# Altium footprint library IoWLabsModules.PcbLib: 54 footprints (part 3 of 4)
Each footprint in its own frame and in the unit in brackets; x right, y up, seen from the top. Pads: shape width x height; smd on the part's side, far side on the other; paste and mask are expansions set on the pad; w line width, h text height; cw(c..) or ccw(c..) is an arc to the next point about the centre after c.
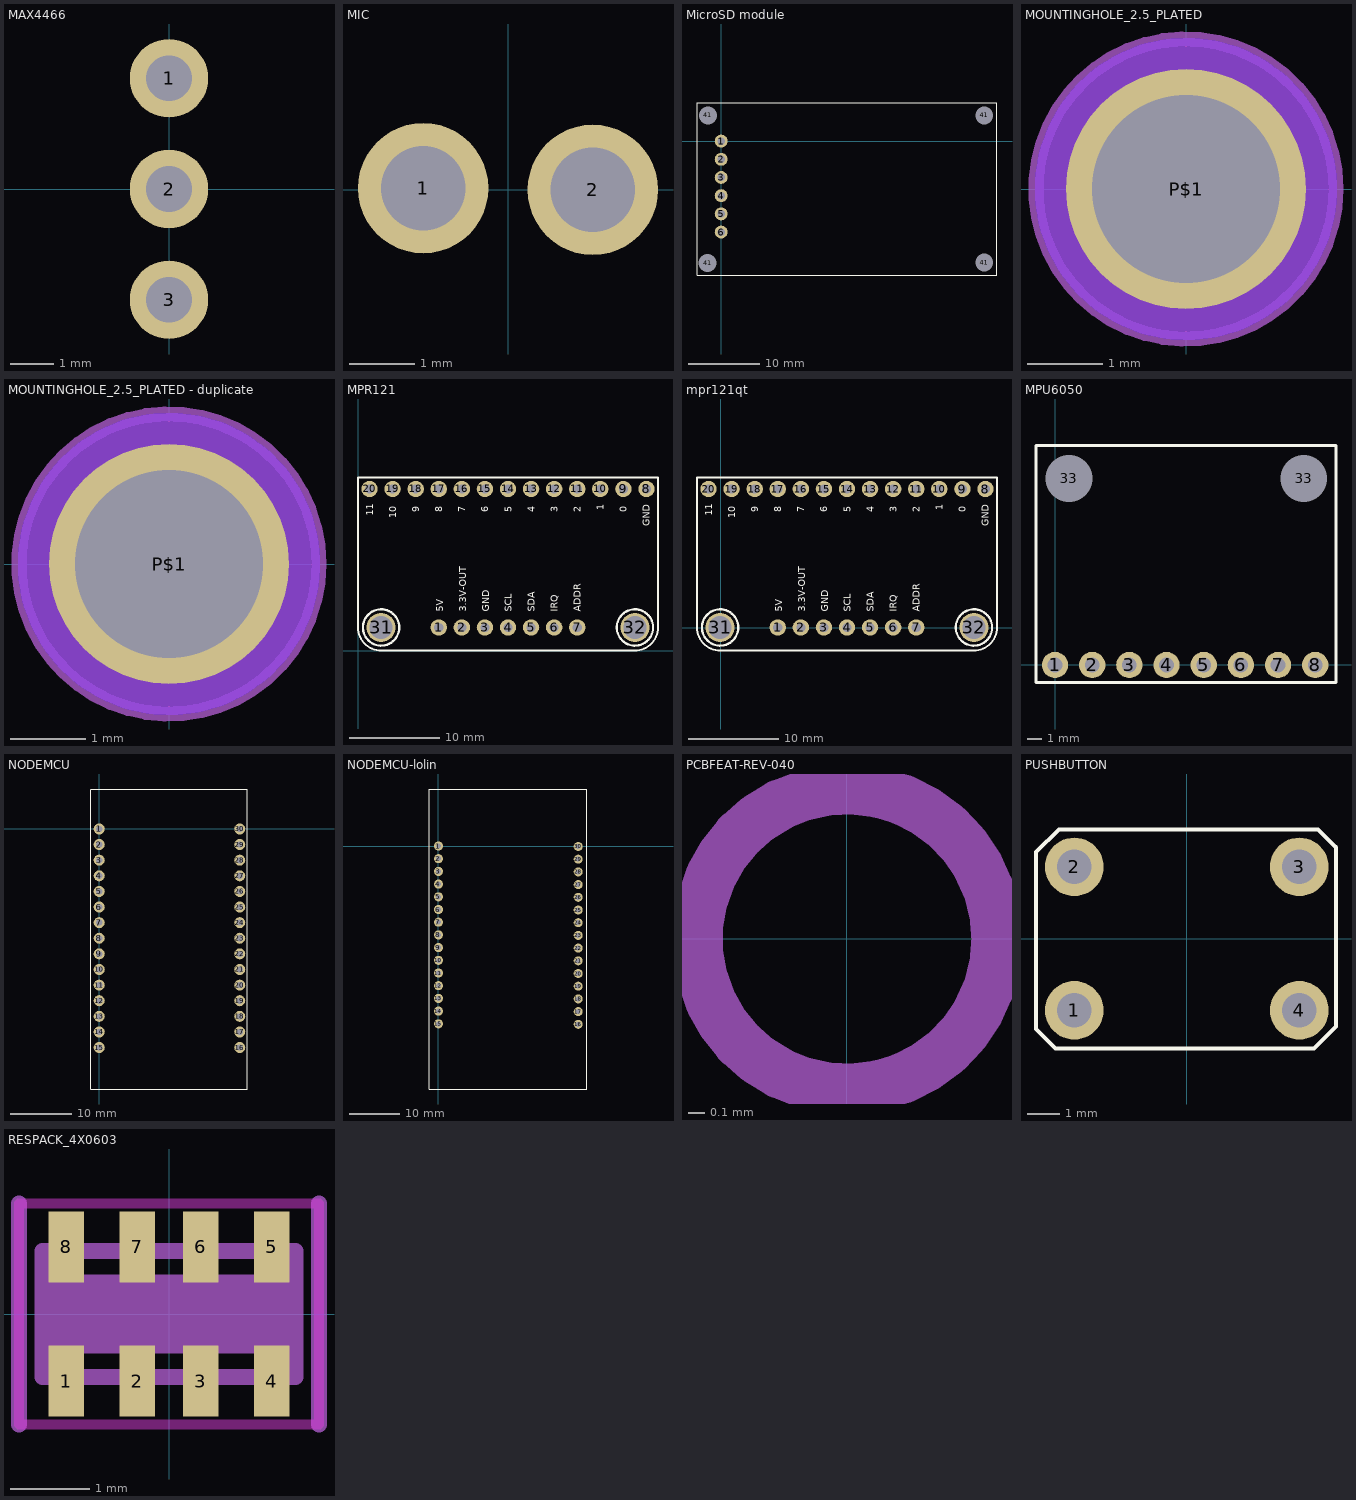
[diagram p2: the footprints below, top view; thin cyan lines are the x and y axes]

## MAX4466 [mm] "max4466 module"
pads (3):
  round 1.8 hole 1.05: 1(0,2.54) 2(0,0) 3(0,-2.54)
3D body "Max4466.STEP": height 8.9, standoff -5.7, extent -1.395,-7.15 20.195,6.82

## MIC [mm] "generic mic"
pads (2):
  round 2 hole 1.3: 1(-1.3,0.025) 2(1.3,0)
3D body "microElectrelet.step": height 4.7, standoff -5, extent -4.897,-4.85 4.797,4.85

## MicroSD module [mm]
pads (10):
  round 1.8 hole 1.05: 1(0,0) 2(0,-2.54) 3(0,-5.08) 4(0,-7.62) 5(0,-10.16) 6(0,-12.7)
  round 1.524 hole 2.5: 41(-1.9,-17.025) 41(-1.85,3.6) 41(36.725,-16.975) 41(36.725,3.575)
Top Overlay:
  lines w0.127: -3.375,-18.75 -3.375,5.375 38.5,5.375 38.5,-18.75 -3.375,-18.75
Bottom Overlay:
  text "GND" at 6.975,-0.8 h1.52
  text "VCC" at 6.975,-3.27 h1.52
  text "MISO" at 6.975,-5.74 h1.52
  text "MOSI" at 6.975,-8.21 h1.52
  text "SCK" at 6.975,-10.68 h1.52
  text "CS" at 6.975,-13.15 h1.52
3D body "MicroSD Reader Assembly.stp": height 6.7, standoff 0, extent -8.427,-18.682 38.473,5.318

## MOUNTINGHOLE_2.5_PLATED [mm] "MOUNTINGHOLE_2.5_PLATED"
pads (1):
  round 3.2 hole 2.5: P$1(0,0)
Top Layer keep-out:
  circle w2.032: c0,0 r1
Bottom Layer keep-out:
  circle w2.032: c0,0 r1
Keep-Out Layer:
  circle w2.032: c0,0 r1
  circle w2.032: c0,0 r1
Mechanical 2:
  circle w0.203: c0,0 r2

## MOUNTINGHOLE_2.5_PLATED - duplicate [mm] "MOUNTINGHOLE_2.5_PLATED"
pads (1):
  round 3.2 hole 2.5: P$1(0,0)
Top Layer keep-out:
  circle w2.032: c0,0 r1
Bottom Layer keep-out:
  circle w2.032: c0,0 r1
Keep-Out Layer:
  circle w2.032: c0,0 r1
  circle w2.032: c0,0 r1
Mechanical 2:
  circle w0.203: c0,0 r2

## MPR121 [mm] "Adafruit MPR121 capacitive touch breakout PCB v1"
pads (22):
  round 1.8 hole 1: 1(8.89,2.54) 2(11.43,2.54) 3(13.97,2.54) 4(16.51,2.54) 5(19.05,2.54) 6(21.59,2.54) 7(24.13,2.54) 8(31.75,17.78) 9(29.21,17.78) 10(26.67,17.78) 11(24.13,17.78) 12(21.59,17.78) 13(19.05,17.78) 14(16.51,17.78) 15(13.97,17.78) 16(11.43,17.78) 17(8.89,17.78) 18(6.35,17.78) 19(3.81,17.78) 20(1.27,17.78)
  round 3.2 hole 2.5: 31(2.54,2.54) 32(30.48,2.54)
Top Overlay:
  circle w0.254: c30.48,2.54 r2
  circle w0.254: c2.54,2.54 r2
  lines w0.2: 0,2.551 ccw(c2.551,2.551) 2.551,0 30.478,0 ccw(c30.478,2.542) 33.02,2.542 33.02,19.05 0,19.05 0,2.551
  text "5V" at 9.375,4.25 h0.76
  text "3.3V-OUT" at 11.9,4.25 h0.76
  text "GND" at 14.425,4.25 h0.76
  text "SCL" at 16.95,4.25 h0.76
  text "SDA" at 19.475,4.25 h0.76
  text "IRQ" at 22,4.25 h0.76
  text "ADDR" at 24.525,4.25 h0.76
  text "11" at 1.675,14.829 h0.76
  text "10" at 4.212,14.575 h0.76
  text "9" at 6.75,15.21 h0.76
  text "8" at 9.287,15.21 h0.76
  text "7" at 11.825,15.21 h0.76
  text "6" at 14.362,15.21 h0.76
  text "5" at 16.9,15.21 h0.76
  text "4" at 19.437,15.21 h0.76
  text "3" at 21.975,15.21 h0.76
  text "2" at 24.512,15.21 h0.76
  text "1" at 27.05,15.464 h0.76
  text "0" at 29.587,15.21 h0.76
  text "GND" at 32.125,13.686 h0.76
3D body "DS1023-1x7SF11.stp": height 8.5, standoff -3, extent 7.22,1.27 25.8,3.81
3D body "DS1023-1x6SF11.stp": height 8.5, standoff -3, extent -0.4,16.51 15.64,19.05
3D body "DS1023-1x7SF11.stp": height 8.5, standoff -3, extent 14.84,16.51 33.42,19.05

## mpr121qt [mm]
pads (22):
  round 1.8 hole 1: 1(6.29,0.04) 2(8.83,0.04) 3(11.37,0.04) 4(13.91,0.04) 5(16.45,0.04) 6(18.99,0.04) 7(21.53,0.04) 8(29.15,15.28) 9(26.61,15.28) 10(24.07,15.28) 11(21.53,15.28) 12(18.99,15.28) 13(16.45,15.28) 14(13.91,15.28) 15(11.37,15.28) 16(8.83,15.28) 17(6.29,15.28) 18(3.75,15.28) 19(1.21,15.28) 20(-1.33,15.28)
  round 3.2 hole 2.5: 31(-0.06,0.04) 32(27.88,0.04)
Top Overlay:
  circle w0.254: c-0.06,0.04 r2
  circle w0.254: c27.88,0.04 r2
  lines w0.2: -2.6,0.051 ccw(c-0.049,0.051) -0.049,-2.5 27.878,-2.5 ccw(c27.878,0.042) 30.42,0.042 30.42,16.55 -2.6,16.55 -2.6,0.051
  text "GND" at 29.525,11.186 h0.76
  text "0" at 26.987,12.71 h0.76
  text "1" at 24.45,12.964 h0.76
  text "2" at 21.912,12.71 h0.76
  text "3" at 19.375,12.71 h0.76
  text "4" at 16.837,12.71 h0.76
  text "5" at 14.3,12.71 h0.76
  text "6" at 11.762,12.71 h0.76
  text "7" at 9.225,12.71 h0.76
  text "8" at 6.687,12.71 h0.76
  text "9" at 4.15,12.71 h0.76
  text "10" at 1.612,12.075 h0.76
  text "11" at -0.925,12.329 h0.76
  text "ADDR" at 21.925,1.75 h0.76
  text "IRQ" at 19.4,1.75 h0.76
  text "SDA" at 16.875,1.75 h0.76
  text "SCL" at 14.35,1.75 h0.76
  text "GND" at 11.825,1.75 h0.76
  text "3.3V-OUT" at 9.3,1.75 h0.76
  text "5V" at 6.775,1.75 h0.76
3D body "DS1023-1x7SF11.stp": height 8.5, standoff -3, extent 12.24,14.01 30.82,16.55
3D body "DS1023-1x6SF11.stp": height 8.5, standoff -3, extent -3,14.01 13.04,16.55
3D body "DS1023-1x7SF11.stp": height 8.5, standoff -3, extent 4.62,-1.23 23.2,1.31

## MPU6050 [mm] "accelerometer module"
pads (10):
  round 1.8 hole 1: 1(0,0) 2(2.54,0) 3(5.08,0) 4(7.62,0) 5(10.16,0) 6(12.7,0) 7(15.24,0) 8(17.78,0)
  round 1.524 hole 3.2: 33(0.95,12.75) 33(17,12.75)
Top Overlay:
  lines w0.2: -1.3,-1.2 19.2,-1.2 19.2,15 -1.3,15 -1.3,-1.2
3D body "MPU_6050.step": height 3, standoff 0, extent -1.3,-1 19.2,15

## NODEMCU [mm] "NodeMCU ESP8266"
pads (30):
  round 1.8 hole 1: 1(0,0) 2(0,-2.54) 3(0,-5.08) 4(0,-7.62) 5(0,-10.16) 6(0,-12.7) 7(0,-15.24) 8(0,-17.78) 9(0,-20.32) 10(0,-22.86) 11(0,-25.4) 12(0,-27.94) 13(0,-30.48) 14(0,-33.02) 15(0,-35.56) 16(22.86,-35.56) 17(22.86,-33.02) 18(22.86,-30.48) 19(22.86,-27.94) 20(22.86,-25.4) 21(22.86,-22.86) 22(22.86,-20.32) 23(22.86,-17.78) 24(22.86,-15.24) 25(22.86,-12.7) 26(22.86,-10.16) 27(22.86,-7.62) 28(22.86,-5.08) 29(22.86,-2.54) 30(22.86,0)
Top Overlay:
  lines w0.2: -1.4,-42.3 24.1,-42.3 24.1,6.5 -1.3,6.5 -1.4,6.4 -1.4,-42.3
3D body "ESP8266 v7.stp": height 7.85, standoff -6.24, extent -1.425,-42.32 24.125,6.5

## NODEMCU-lolin [mm] "NODEMCU-lolin. ESP8266"
pads (30):
  round 1.8 hole 1: 1(0,0) 2(0,-2.54) 3(0,-5.08) 4(0,-7.62) 5(0,-10.16) 6(0,-12.7) 7(0,-15.24) 8(0,-17.78) 9(0,-20.32) 10(0,-22.86) 11(0,-25.4) 12(0,-27.94) 13(0,-30.48) 14(0,-33.02) 15(0,-35.56) 16(27.94,-35.66) 17(27.94,-33.12) 18(27.94,-30.58) 19(27.94,-28.04) 20(27.94,-25.5) 21(27.94,-22.96) 22(27.94,-20.42) 23(27.94,-17.88) 24(27.94,-15.34) 25(27.94,-12.8) 26(27.94,-10.26) 27(27.94,-7.72) 28(27.94,-5.18) 29(27.94,-2.64) 30(27.94,-0.1)
Top Overlay:
  lines w0.1: -1.9,-48.6 29.7,-48.6 29.7,11.4 -1.9,11.4 -1.9,-48.6
3D body "Lolin NodeMCU ESP8266 V3.STEP": height 7.1, standoff -6.04, extent -1.85,-48.58 29.65,11.4

## PCBComponent_1 [mm]

## PCBFEAT-REV-040 [mm] "PCBFEAT-REV-040"
Mechanical 2:
  circle w0.305: c0,0 r0.898

## PUSHBUTTON [mm] "PushButton tactil"
pads (4):
  round 1.8 hole 1.05: 1(-3.45,-2.2) 2(-3.45,2.2) 3(3.45,2.2) 4(3.45,-2.2)
Top Overlay:
  lines w0.127: -4.625,-2.775 -4.025,-3.375 3.9,-3.375 4.575,-2.7 4.575,2.8 4.025,3.35 -3.925,3.35 -4.625,2.65 -4.625,-2.775
3D body "Push Tactile Button SPST-NO 6x6mm L=5mm Omron B3F-1020.stp": height 4, standoff -3.5, extent -3.85,-3 3.851,3

## QFN20_3MM_NOTHERMAL [mm] "QFN20_3MM_NOTHERMAL"

## rele [mm]

## RESPACK_4X0603 [mm] "RESPACK_4X0603"
pads (8):
  rect 0.45x0.9 smd: 1(-1.3,-0.85) 2(-0.4,-0.85) 3(0.4,-0.85) 4(1.3,-0.85) 5(1.3,0.85) 6(0.4,0.85) 7(-0.4,0.85) 8(-1.3,0.85)
Keep-Out Layer:
  lines w0.127: -1.9,-1.4 -1.9,1.4 1.9,1.4 1.9,-1.4 -1.9,-1.4
Mechanical 2:
  lines w0.203: -1.9,-1.4 -1.9,1.4 ; 1.9,-1.4 1.9,1.4
Mechanical 18:
  rectangle: -1.55,-0.5 1.55,0.5
  lines w0.203: -1.6,-0.8 1.6,-0.8 1.6,0.8 -1.6,0.8 -1.6,-0.8